# Altium integrated library CbyP.IntLib: 1144 symbols (part 4 of 6) (continued)
## RTC DS3231 (continued)

## TFT LCD MODULE 0.96INCH 80X160RGB
designator M?, comment TFT 0.96'
2.4 SPLC780 LCD Screen ROHS; Manufacturer: Newvisio; Mfr.Part #: N096-1608TBBIG11-H13; Name: LCD 2TFT LCD MODULE 0.96INCH 80X160RGB0x4; So_Chan_Dan: 13; So_Chan_Cam: 0; Package: SMD
footprint TFT LCD MODULE  0.96 inch 80RGB*160DOTS
pins: 1 NC, 2 NC, 3 SDA, 4 SCL, 5 RS, 6 RES, 7 CS, 8 GND, 9 NC, 10 VCC, 11 LEDK, 12 LEDA, 13 GND

## VC-02_EN
designator M?, comment VC-02
RF TXRX MODULE OFFLINE VOICE SMD; Manufacturer: Ai-Thinker; Mfr.Part #: VC-02_EN; Package: SMD,17x18mm; DigiKey Part Number: 4570-VC-02TR-ND; LCSC Part #: C3039678
footprint SMD,17x18mm(VC-02)
pins: 1 DAC_R, 2 MIC-, 3 MIC+, 4 TX1, 5 RX1, 6 IOA25, 7 NC, 8 SDA, 9 SCL, 10 IOB0, 11 IOB1, 12 NC, 13 IOA26, 14 DAC_L, 15 IOB8, 16 IOA27, 17 VCC, 18 GND, 19 SPK-, 20 SPK+

## VRB1212LD-10WR3
designator M?
Plugin Isolated Power Modules ROHS; Manufacturer: HI-LINK; So_Chan_Dan: 0; So_Chan_Cam: 4; Mfr.Part #: VRB1212LD-10WR3; Package: Plugin; Name: VRB1212LD-10WR3
footprint VRBXXXXLD-10WR3
pins: 1 +VIN, 2 -VIN, 3 +VO, 5 GND


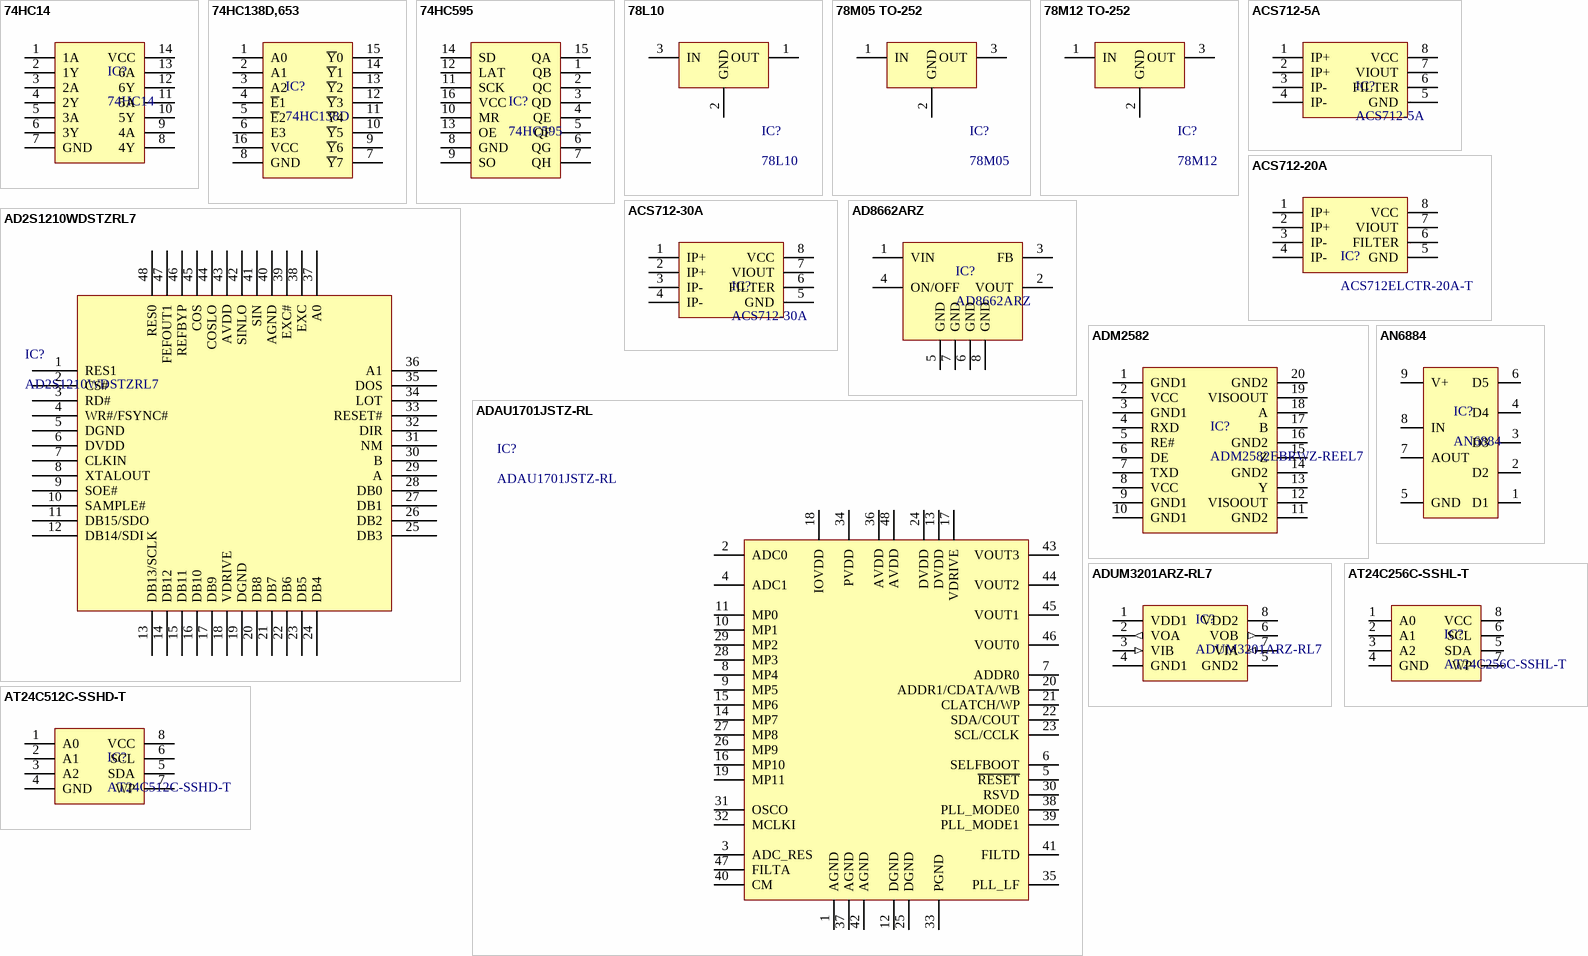
[diagram p25: symbols 74HC14 to AT24C512C-SSHD-T]

## 74HC14
designator IC?
2V~6V 6 SOP-14 Inverters ROHS; Manufacturer: JSMSEMI; So_Chan_Dan: 14; So_Chan_Cam: 0; Mfr.Part #: 74HC14; Package: SOP-14; Name: 74HC14
footprint SOP-14
pins: 1 1A, 2 1Y, 3 2A, 4 2Y, 5 3A, 6 3Y, 7 GND, 8 4Y, 9 4A, 10 5Y, 11 5A, 12 6Y, 13 6A, 14 VCC

## 74HC138D,653
designator IC?, comment 74HC138D
3/8 2V~6V 160uA 15ns@4.5V,50pF SOIC-16 Signal Switches, Multiplexers, Decoders RoHS; Manufacturer: Nexperia; Mfr.Part #: 74HC138D,653; Package: SOIC-16; LCSC Part #: C5602; DigiKey Part Number: 1727-2781-2-ND
footprint SOIC-16
pins: 1 A0, 2 A1, 3 A2, 4 ~{E}1, 5 ~{E}2, 6 E3, 7 ~{Y}7, 8 GND, 9 ~{Y}6, 10 ~{Y}5, 11 ~{Y}4, 12 ~{Y}3, 13 ~{Y}2, 14 ~{Y}1, 15 ~{Y}0, 16 VCC

## 74HC595
designator IC?
SOP-16 Shifting Register ROHS; Manufacturer: JSMSEMI; Mfr.Part #: 74HC595D; So_Chan_Cam: 0; So_Chan_Dan: 16; Package: SOP-16; Name: 74hc595
footprint SOP-16
pins: 1 QB, 2 QC, 3 QD, 4 QE, 5 QF, 6 QG, 7 QH, 8 GND, 9 SO, 10 MR, 11 SCK, 12 LAT, 13 OE, 14 SD, 15 QA, 16 VCC

## 78L10
designator IC?
100mA Fixed 10V Positive electrode 30V SOT-89 Voltage Regulators - Linear, Low Drop Out (LDO) Regulators ROHS; Manufacturer: MSKSEMI; Mfr.Part #: MS78L10; So_Chan_Dan: 3; So_Chan_Cam: 0; Name: 78L10; ComponentLink1Description: New link; ComponentLink1URL: https://www.lcsc.com/datasheet/lcsc_datasheet_2311231510_MSKSEMI-AMS1117-5-0V_C7473143.pdf; Package: SOT-89
footprint SOT-89
pins: 1 OUT, 2 GND, 3 IN

## 78M05 TO-252
designator IC?, comment 78M05
500mA Fixed 5V Positive electrode 35V TO-252-2L Linear Voltage Regulators (LDO) ROHS; Manufacturer: Jiangsu Changjing Electronics Technology Co., Ltd.; Mfr.Part #: CJ78M05; So_Chan_Dan: 3; So_Chan_Cam: 0; Package: TO-252-2L; Name: 78M05
footprint TO-252
pins: 1 IN, 2 GND, 3 OUT

## 78M12 TO-252
designator IC?, comment 78M12
500mA 80dB@(120Hz) null 12V Positive electrode 35V TO-252 Linear Voltage Regulators (LDO) ROHS; Manufacturer: MSKSEMI; Mfr.Part #: 78M12-MS; So_Chan_Dan: 3; So_Chan_Cam: 0; Name: 78M12; ComponentLink1Description: New link; ComponentLink1URL: https://www.lcsc.com/datasheet/lcsc_datasheet_2210271600_MSKSEMI-78M12-MS_C5174620.pdf; Package: TO-252
footprint TO-252
pins: 1 IN, 2 GND, 3 OUT

## ACS712-5A
designator IC?
5A SOIC-8 Current Sensors ROHS; Manufacturer: Allegro MicroSystems, LLC; Mfr.Part #: ACS712ELCTR-05B-T; So_Chan_Dan: 8; So_Chan_Cam: 0; Package: SOIC-8; Name: ACS712-5A
footprint SOIC-8
pins: 1 IP+, 2 IP+, 3 IP-, 4 IP-, 5 GND, 6 FILTER, 7 VIOUT, 8 VCC

## ACS712-20A
designator IC?, comment ACS712ELCTR-20A-T
20A SOIC-8 Current Sensors ROHS; Manufacturer: Allegro MicroSystems, LLC; Name: ACS712; So_Chan_Dan: 8; So_Chan_Cam: 0; Mfr.Part #: ACS712ELCTR-20A-T; Package: SOIC-8
footprint SOIC-8
pins: 1 IP+, 2 IP+, 3 IP-, 4 IP-, 5 GND, 6 FILTER, 7 VIOUT, 8 VCC

## ACS712-30A
designator IC?
30A SOIC-8 Current Sensors ROHS; Manufacturer: Allegro MicroSystems, LLC; Mfr.Part #: ACS712ELCTR-30A-T; So_Chan_Dan: 8; So_Chan_Cam: 0; Package: SOIC-8; Name: ACS712-30A
footprint SOIC-8
pins: 1 IP+, 2 IP+, 3 IP-, 4 IP-, 5 GND, 6 FILTER, 7 VIOUT, 8 VCC

## AD2S1210WDSTZRL7
designator IC?
4.75V~5.25V LQFP-48(7x7) ADCs/DACs - Special Purpose ROHS; Manufacturer: Analog Devices; So_Chan_Dan: 48; So_Chan_Cam: 0; Mfr.Part #: AD2S1210WDSTZRL7; Package: LQFP-48(7x7); Name: AD2S1210WDSTZRL7
footprint LQFP-48(7x7)
pins: 1 RES1, 2 CS#, 3 RD#, 4 WR#/FSYNC#, 5 DGND, 6 DVDD, 7 CLKIN, 8 XTALOUT, 9 SOE#, 10 SAMPLE#, 11 DB15/SDO, 12 DB14/SDI, 13 DB13/SCLK, 14 DB12, 15 DB11, 16 DB10, 17 DB9, 18 VDRIVE, 19 DGND, 20 DB8, 21 DB7, 22 DB6, 23 DB5, 24 DB4, 25 DB3, 26 DB2, 27 DB1, 28 DB0, 29 A, 30 B, 31 NM, 32 DIR, 33 RESET#, 34 LOT, 35 DOS, 36 A1, 37 A0, 38 EXC, 39 EXC#, 40 AGND, 41 SIN, 42 SINLO, 43 AVDD, 44 COSLO, 45 COS, 46 REFBYP, 47 FEFOUT1, 48 RES0

## AD8662ARZ
designator IC?
4MHz 0.3pA Dual channel SOIC-8 Precision Op Amps ROHS; Manufacturer: Analog Devices; Mfr.Part #: AD8662ARZ-REEL7; So_Chan_Dan: 6; So_Chan_Cam: 0; Packahe: SOIC-8; Name: AD8662ARZ
footprint SOIC-8
pins: 1 VIN, 2 VOUT, 3 FB, 4 ON/OFF, 5 GND, 6 GND, 7 GND, 8 GND

## ADAU1701JSTZ-RL
designator IC?
192kHz LQFP-48(7x7) DSP (Digital Signal Processors) RoHS; Manufacturer: ADI; Mfr.Part #: ADAU1701JSTZ-RL; Package: LQFP-48(7x7); LCSC Part #: C389590; ComponentLink1Description: Link; ComponentLink1URL: https://www.lcsc.com/product-detail/C389590.html?s_z=n_C389590; ComponentLink2Description: Link 1; ComponentLink2URL: https://www.digikey.com/en/products/detail/analog-devices-inc/ADAU1701JSTZ-RL/1555944?s=N4IgTCBcDaIIIBE4FUCMB2ADKgUgZQBUAtAWgCUAZEAXQF8g; DigiKey Part Number: ADAU1701JSTZ-RLTR-ND
footprint LQFP-48(7x7)
pins: 1 AGND, 2 ADC0, 3 ADC_RES, 4 ADC1, 5 ~{RESET}, 6 SELFBOOT, 7 ADDR0, 8 MP4, 9 MP5, 10 MP1, 11 MP0, 12 DGND, 13 DVDD, 14 MP7, 15 MP6, 16 MP10, 17 VDRIVE, 18 IOVDD, 19 MP11, 20 ADDR1/CDATA/WB, 21 CLATCH/WP, 22 SDA/COUT, 23 SCL/CCLK, 24 DVDD, 25 DGND, 26 MP9, 27 MP8, 28 MP3, 29 MP2, 30 RSVD, 31 OSCO, 32 MCLKI, 33 PGND, 34 PVDD, 35 PLL_LF, 36 AVDD, 37 AGND, 38 PLL_MODE0, 39 PLL_MODE1, 40 CM, 41 FILTD, 42 AGND, 43 VOUT3, 44 VOUT2, 45 VOUT1, 46 VOUT0, 47 FILTA, 48 AVDD

## ADM2582
designator IC?, comment ADM2582EBRWZ-REEL7
SOIC-20-300mil Isolated RS-485/422 Transceivers ROHS; MF: Texas Instruments; MP: SN74HC540DWE4; Purchase-URL: https://pricing.snapeda.com/search/part/SN74HC540DWE4/?ref=eda; Value: *; Package: SOIC-20 Texas Instruments; Check_prices: https://www.snapeda.com/parts/SN74HC540DWE4/Texas+Instruments/view-part/?ref=eda; Price: None; Availability: In Stock; SnapEDA_Link: https://www.snapeda.com/parts/SN74HC540DWE4/Texas+Instruments/view-part/?ref=snap
footprint SOI-20-300mil
pins: 1 GND1, 2 VCC, 3 GND1, 4 RXD, 5 RE#, 6 DE, 7 TXD, 8 VCC, 9 GND1, 10 GND1, 11 GND2, 12 VISOOUT, 13 Y, 14 GND2, 15 Z, 16 GND2, 17 B, 18 A, 19 VISOOUT, 20 GND2

## ADUM3201ARZ-RL7
designator IC?
SOIC-8 Digital Isolators ROHS; Manufacturer: Analog Devices; So_Chan_Dan: 8; So_Chan_Cam: 0; Mfr.Part #: ADUM3201ARZ-RL7; Package: SOIC-8; Name: ADUM3201ARZ-RL7
footprint SOIC-8
pins: 1 VDD1, 2 VOA (out), 3 VIB (in), 4 GND1, 5 GND2, 6 VOB (out), 7 VIA (in), 8 VDD2

## AN6884
designator IC?
MF: Panasonic; Package: None; Value: *; MP: AN6884
footprint SIP9
pins: 1 D1, 2 D2, 3 D3, 4 D4, 5 GND, 6 D5, 7 AOUT, 8 IN, 9 V+

## AT24C256C-SSHL-T
designator IC?
1.7V~5.5V 256Kbit 1MHz I2C SOIC-8 Memory (ICs) RoHS; Manufacturer: Microchip Tech; Mfr.Part #: AT24C256C-SSHL-T; Package: SOIC-8; LCSC Part #: C6482; ComponentLink1Description: Link; ComponentLink1URL: https://www.lcsc.com/product-detail/C6482.html?s_z=n_C6482; DigiKey Part Number: AT24C256C-SSHL-TTR-ND; ComponentLink2Description: Link 1; ComponentLink2URL: https://www.digikey.com/en/products/detail/microchip-technology/AT24C256C-SSHL-T/2271166?s=N4IgTCBcDaIIIBUwBYDCYCsA2VBaAyvgBIAyuCIAugL5A
footprint SOIC-8
pins: 1 A0, 2 A1, 3 A2, 4 GND, 5 SDA, 6 SCL, 7 WP, 8 VCC

## AT24C512C-SSHD-T
designator IC?
512Kbit 1MHz I2C SOIC-8 EEPROM ROHS; Manufacturer: MICROCHIP; Mfr.Part #: AT24C512C-SSHD-T; Package: SOIC-8; LCSC Part #: C12371
footprint SOIC-8
pins: 1 A0, 2 A1, 3 A2, 4 GND, 5 SDA, 6 SCL, 7 WP, 8 VCC

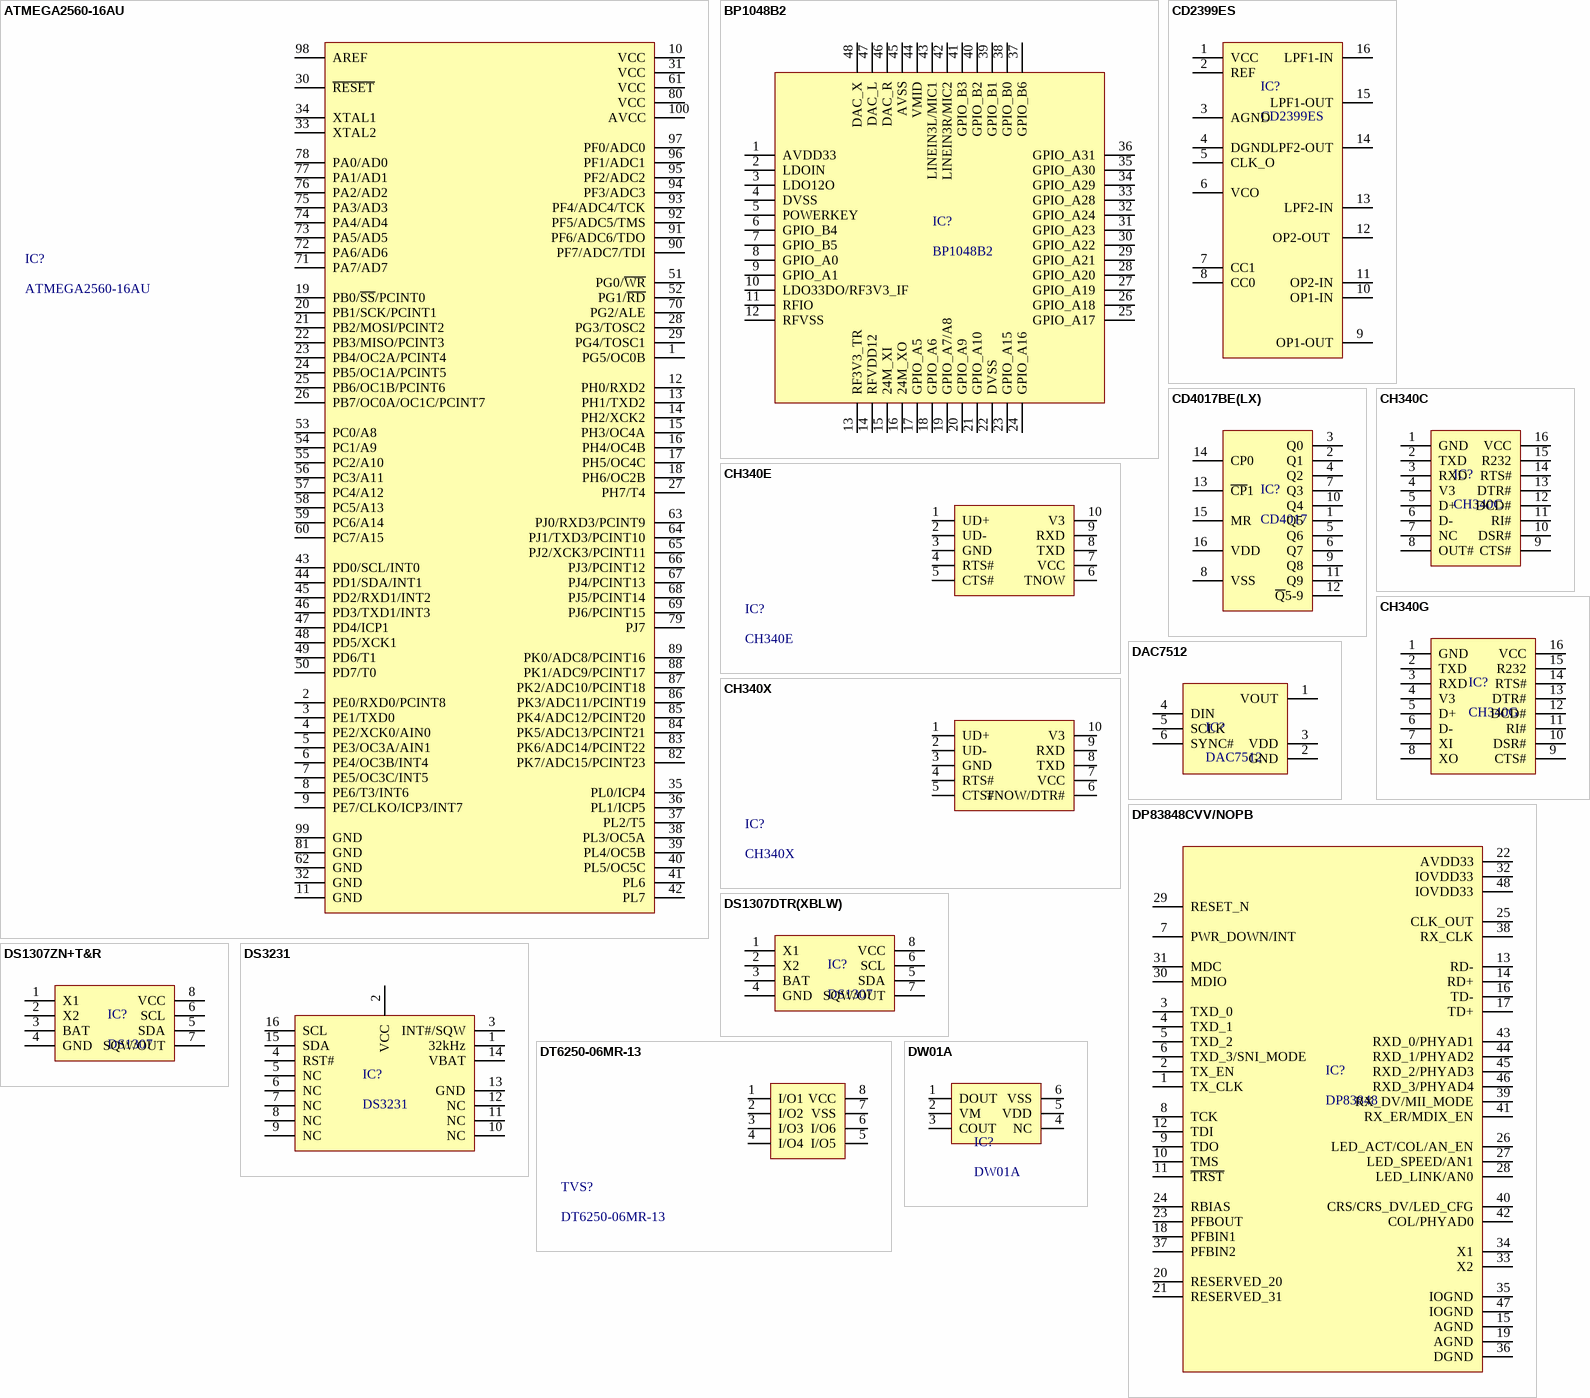
[diagram p26: symbols ATMEGA2560-16AU to DW01A]

## ATMEGA2560-16AU
designator IC?
AVR 16MHz TQFP-100(14x14) Microcontrollers (MCU/MPU/SOC) ROHS; Manufacturer: Microchip Tech; Name: STM32H750VBT6; So_Chan_Dan: 100; So_Chan_Cam: 0; Mfr.Part #: ATMEGA2560-16AU; Package: TQFP-100(14x14)
footprint TQFP-100(14x14)
pins: 1 PG5/OC0B, 2 PE0/RXD0/PCINT8, 3 PE1/TXD0, 4 PE2/XCK0/AIN0, 5 PE3/OC3A/AIN1, 6 PE4/OC3B/INT4, 7 PE5/OC3C/INT5, 8 PE6/T3/INT6, 9 PE7/CLKO/ICP3/INT7, 10 VCC, 11 GND (power), 12 PH0/RXD2, 13 PH1/TXD2, 14 PH2/XCK2, 15 PH3/OC4A, 16 PH4/OC4B, 17 PH5/OC4C, 18 PH6/OC2B, 19 PB0/~{SS}/PCINT0, 20 PB1/SCK/PCINT1, 21 PB2/MOSI/PCINT2, 22 PB3/MISO/PCINT3, 23 PB4/OC2A/PCINT4, 24 PB5/OC1A/PCINT5, 25 PB6/OC1B/PCINT6, 26 PB7/OC0A/OC1C/PCINT7, 27 PH7/T4, 28 PG3/TOSC2, 29 PG4/TOSC1, 30 ~{RESET}, 31 VCC, 32 GND (power), 33 XTAL2, 34 XTAL1, 35 PL0/ICP4, 36 PL1/ICP5, 37 PL2/T5, 38 PL3/OC5A, 39 PL4/OC5B, 40 PL5/OC5C, 41 PL6, 42 PL7, 43 PD0/SCL/INT0, 44 PD1/SDA/INT1, 45 PD2/RXD1/INT2, 46 PD3/TXD1/INT3, 47 PD4/ICP1, 48 PD5/XCK1, 49 PD6/T1, 50 PD7/T0, 51 PG0/~{WR}, 52 PG1/~{RD}, 53 PC0/A8, 54 PC1/A9, 55 PC2/A10, 56 PC3/A11, 57 PC4/A12, 58 PC5/A13, 59 PC6/A14, 60 PC7/A15, 61 VCC, 62 GND (power), 63 PJ0/RXD3/PCINT9, 64 PJ1/TXD3/PCINT10, 65 PJ2/XCK3/PCINT11, 66 PJ3/PCINT12, 67 PJ4/PCINT13, 68 PJ5/PCINT14, 69 PJ6/PCINT15, 70 PG2/ALE, 71 PA7/AD7, 72 PA6/AD6, 73 PA5/AD5, 74 PA4/AD4, 75 PA3/AD3, 76 PA2/AD2, 77 PA1/AD1, 78 PA0/AD0, 79 PJ7, 80 VCC, 81 GND (power), 82 PK7/ADC15/PCINT23, 83 PK6/ADC14/PCINT22, 84 PK5/ADC13/PCINT21, 85 PK4/ADC12/PCINT20, 86 PK3/ADC11/PCINT19, 87 PK2/ADC10/PCINT18, 88 PK1/ADC9/PCINT17, 89 PK0/ADC8/PCINT16, 90 PF7/ADC7/TDI, 91 PF6/ADC6/TDO, 92 PF5/ADC5/TMS, 93 PF4/ADC4/TCK, 94 PF3/ADC3, 95 PF2/ADC2, 96 PF1/ADC1, 97 PF0/ADC0, 98 AREF, 99 GND (power), 100 AVCC

## BP1048B2
designator IC?
Manufacturer: MVLISICON; So_Chan_Dan: 48; So_Chan_Cam: 0; Mfr.Part #: BP1048B2; Package: LQFP-48(7x7); Name: BP1048B2
footprint LQFP-48(7x7)
pins: 1 AVDD33, 2 LDOIN, 3 LDO12O, 4 DVSS, 5 POWERKEY, 6 GPIO_B4, 7 GPIO_B5, 8 GPIO_A0, 9 GPIO_A1, 10 LDO33DO/RF3V3_IF, 11 RFIO, 12 RFVSS, 13 RF3V3_TR, 14 RFVDD12, 15 24M_XI, 16 24M_XO, 17 GPIO_A5, 18 GPIO_A6, 19 GPIO_A7/A8, 20 GPIO_A9, 21 GPIO_A10, 22 DVSS, 23 GPIO_A15, 24 GPIO_A16, 25 GPIO_A17, 26 GPIO_A18, 27 GPIO_A19, 28 GPIO_A20, 29 GPIO_A21, 30 GPIO_A22, 31 GPIO_A23, 32 GPIO_A24, 33 GPIO_A28, 34 GPIO_A29, 35 GPIO_A30, 36 GPIO_A31, 37 GPIO_B6, 38 GPIO_B0, 39 GPIO_B1, 40 GPIO_B2, 41 GPIO_B3, 42 LINEIN3R/MIC2, 43 LINEIN3L/MIC1, 44 VMID, 45 AVSS, 46 DAC_R, 47 DAC_L, 48 DAC_X

## CD2399ES
designator IC?
Processor SOP-16 Audio Special Purpose RoHS; Manufacturer: GREENMICRO; Mfr.Part #: CD2399ES; Package: SOP-16; LCSC Part #: C51927339; DigiKey Part Number: NO; ComponentLink1Description: Link; ComponentLink1URL: https://www.lcsc.com/product-detail/C51927339.html?s_z=n_CD2399
footprint SOIC-16
pins: 1 VCC, 2 REF, 3 AGND, 4 DGND, 5 CLK_O, 6 VCO, 7 CC1, 8 CC0, 9 OP1-OUT, 10 OP1-IN, 11 OP2-IN, 12 OP2-OUT , 13 LPF2-IN, 14 LPF2-OUT, 15 LPF1-OUT, 16 LPF1-IN

## CD4017BE(LX)
designator IC?, comment CD4017
Rising Edge 1 11MHz DIP-16 Counters, Dividers RoHS; Manufacturer: lingxingic; Mfr.Part #: CD4017BE(LX); LCSC Part #: C32710674; Package: DIP-16; DigiKey Part Number: NO
footprint DIP-16
pins: 1 Q5, 2 Q1, 3 Q0, 4 Q2, 5 Q6, 6 Q7, 7 Q3, 8 VSS, 9 Q8, 10 Q4, 11 Q9, 12 ~{Q}5-9, 13 ~{CP}1, 14 CP0, 15 MR, 16 VDD

## CH340C
designator IC?
Transceiver 2Mbps USB 2.0 SOP-16 Interface Controllers RoHS; Manufacturer: WCH; Mfr.Part #: CH340C; Package: SOP-16; LCSC Part #: C84681; ComponentLink1Description: Link; ComponentLink1URL: https://www.lcsc.com/product-detail/C84681.html?s_z=n_CH340C; ComponentLink2Description: Link 1; ComponentLink2URL: *; DigiKey Part Number: NO
footprint SOIC-16
pins: 1 GND, 2 TXD, 3 RXD, 4 V3, 5 D+, 6 D-, 7 NC, 8 OUT#, 9 CTS#, 10 DSR#, 11 RI#, 12 DCD#, 13 DTR#, 14 RTS#, 15 R232, 16 VCC

## CH340E
designator IC?
Transceiver 2Mbps USB 2.0 MSOP-10 Interface Controllers RoHS; Manufacturer: WCH; Mfr.Part #: CH340E; Package: MSOP-10; LCSC Part #: C99652; DigiKey Part Number: NO; ComponentLink1Description: Link; ComponentLink1URL: https://www.lcsc.com/product-detail/C99652.html?s_z=n_CH340E; ComponentLink2Description: Link 1
footprint MSOP-10
pins: 1 UD+, 2 UD-, 3 GND, 4 RTS#, 5 CTS#, 6 TNOW, 7 VCC, 8 TXD, 9 RXD, 10 V3

## CH340G
designator IC?
2Mbps USB to UART USB 2.0 SOP-16 USB Converters ROHS; Manufacturer: WCH(Jiangsu Qin Heng); So_Chan_Dan: 16; So_Chna_Cam: 0; Mfr.Part #: CH340G; Package: SOP-16; Name: CH340G
footprint SOP-16
pins: 1 GND, 2 TXD, 3 RXD, 4 V3, 5 D+, 6 D-, 7 XI, 8 XO, 9 CTS#, 10 DSR#, 11 RI#, 12 DCD#, 13 DTR#, 14 RTS#, 15 R232, 16 VCC

## CH340X
designator IC?
2Mbps Transceiver USB 2.0 SOP-16 USB Converters ROHS; Manufacturer: WCH(Jiangsu Qin Heng); Mfr.Part #: CH340X; Package: MSOP-10; LCSC Part #: C3035748; DigiKey Part Number: NO; ComponentLink1Description: Link; ComponentLink1URL: https://www.lcsc.com/product-detail/C3035748.html?s_z=n_C3035748; ComponentLink2Description: Link 1
footprint MSOP-10
pins: 1 UD+, 2 UD-, 3 GND, 4 RTS#, 5 CTS#, 6 TNOW/DTR#, 7 VCC, 8 TXD, 9 RXD, 10 V3

## DAC7512
designator IC?
10us 2.7V~5.5V 12 Bits SOT-23-6 Digital to Analog Converters (DAC) ROHS; Manufacturer: Texas Instruments; Mfr.Part #: DAC7512N/3K; So_Chan_Dan: 6; So_Chan_Cam: 0; Package: SOT23-6; Name: DAC7512
footprint SOT23-6
pins: 1 VOUT, 2 GND, 3 VDD (power), 4 DIN (power), 5 SCLK (power), 6 SYNC#

## DP83848CVV/NOPB
designator IC?, comment DP83848
PHY Transceiver 3.3V LQFP-48(7x7) Drivers, Receivers, Transceivers RoHS; Manufacturer: TI; Mfr.Part #: DP83848IVVX/NOPB; Package: LQFP-48(7x7); LCSC Part #: C12082; DigiKey Part Number: DP83848IVVX/NOPBTR-ND
footprint LQFP-48(7x7)
pins: 1 TX_CLK, 2 TX_EN, 3 TXD_0, 4 TXD_1, 5 TXD_2, 6 TXD_3/SNI_MODE, 7 PWR_DOWN/INT, 8 TCK, 9 TDO, 10 TMS, 11 ~{TRST}, 12 TDI, 13 RD-, 14 RD+, 15 AGND, 16 TD-, 17 TD+, 18 PFBIN1, 19 AGND, 20 RESERVED_20, 21 RESERVED_31, 22 AVDD33, 23 PFBOUT, 24 RBIAS, 25 CLK_OUT, 26 LED_ACT/COL/AN_EN, 27 LED_SPEED/AN1, 28 LED_LINK/AN0, 29 RESET_N, 30 MDIO, 31 MDC, 32 IOVDD33, 33 X2, 34 X1, 35 IOGND, 36 DGND, 37 PFBIN2, 38 RX_CLK, 39 RX_DV/MII_MODE, 40 CRS/CRS_DV/LED_CFG, 41 RX_ER/MDIX_EN, 42 COL/PHYAD0, 43 RXD_0/PHYAD1, 44 RXD_1/PHYAD2, 45 RXD_2/PHYAD3, 46 RXD_3/PHYAD4, 47 IOGND, 48 IOVDD33

## DS1307DTR(XBLW)
designator IC?, comment DS1307
64X8 Serial Real Time Clock; Manufacturer: XBLW; Mfr.Part #: DS1307DTR(XBLW); Package: SOP-8; LCSC Part #: C18723598
footprint SOIC-8
pins: 1 X1, 2 X2, 3 BAT, 4 GND, 5 SDA, 6 SCL, 7 SQW/OUT, 8 VCC

## DS1307ZN+T&R
designator IC?, comment DS1307
External No SOP-8 Real Time Clocks RoHS; Manufacturer: MAXIM; Mfr.Part #: DS1307ZN+T&R; Package: SOP-8; LCSC Part #: C26858; DigiKey Part Number: DS1307ZN+T&RTR-ND
footprint SOIC-8
pins: 1 X1, 2 X2, 3 BAT, 4 GND, 5 SDA, 6 SCL, 7 SQW/OUT, 8 VCC

## DS3231
designator IC?
I2C SOIC-16-300mil Real Time Clocks ROHS; Manufacturer: Texas Instruments; Mfr.Part #: DS3231SN#T&R; So_Chan_Dan: 16; So_Chan_Cam: 0; Name: DS3231; Package: SOIC-16-300mil; Links: https://www.lcsc.com/product-detail/Real-Time-Clocks_Analog-Devices-Inc-Maxim-Integrated-DS3231SN-T-R_C9866.html
footprint SOIC-16-300mil
pins: 1 32kHz, 2 VCC, 3 INT#/SQW, 4 RST#, 5 NC, 6 NC, 7 NC, 8 NC, 9 NC, 10 NC, 11 NC, 12 NC, 13 GND, 14 VBAT, 15 SDA, 16 SCL

## DT6250-06MR-13
designator TVS?
4A@8/20us 10V 6V 5V MSOP-8 TVS Diodes RoHS; So_Chna_Cam: 0; Manufacturer: DIODES; Mfr.Part #: DT6250-06MR-13; Package: MSOP-8; LCSC Part #: C460602; DigiKey Part Number: DT6250-06MR-13DITR-ND
footprint MSOP-8
pins: 1 I/O1, 2 I/O2, 3 I/O3, 4 I/O4, 5 I/O5, 6 I/O6, 7 VSS, 8 VCC